# Altium footprint library 贴片电感.PcbLib: 92 footprints (part 4 of 6)
Each footprint in its own frame and in the unit in brackets; x right, y up, seen from the top. Pads: shape width x height; smd on the part's side, far side on the other; paste and mask are expansions set on the pad; w line width, h text height; cw(c..) or ccw(c..) is an arc to the next point about the centre after c.
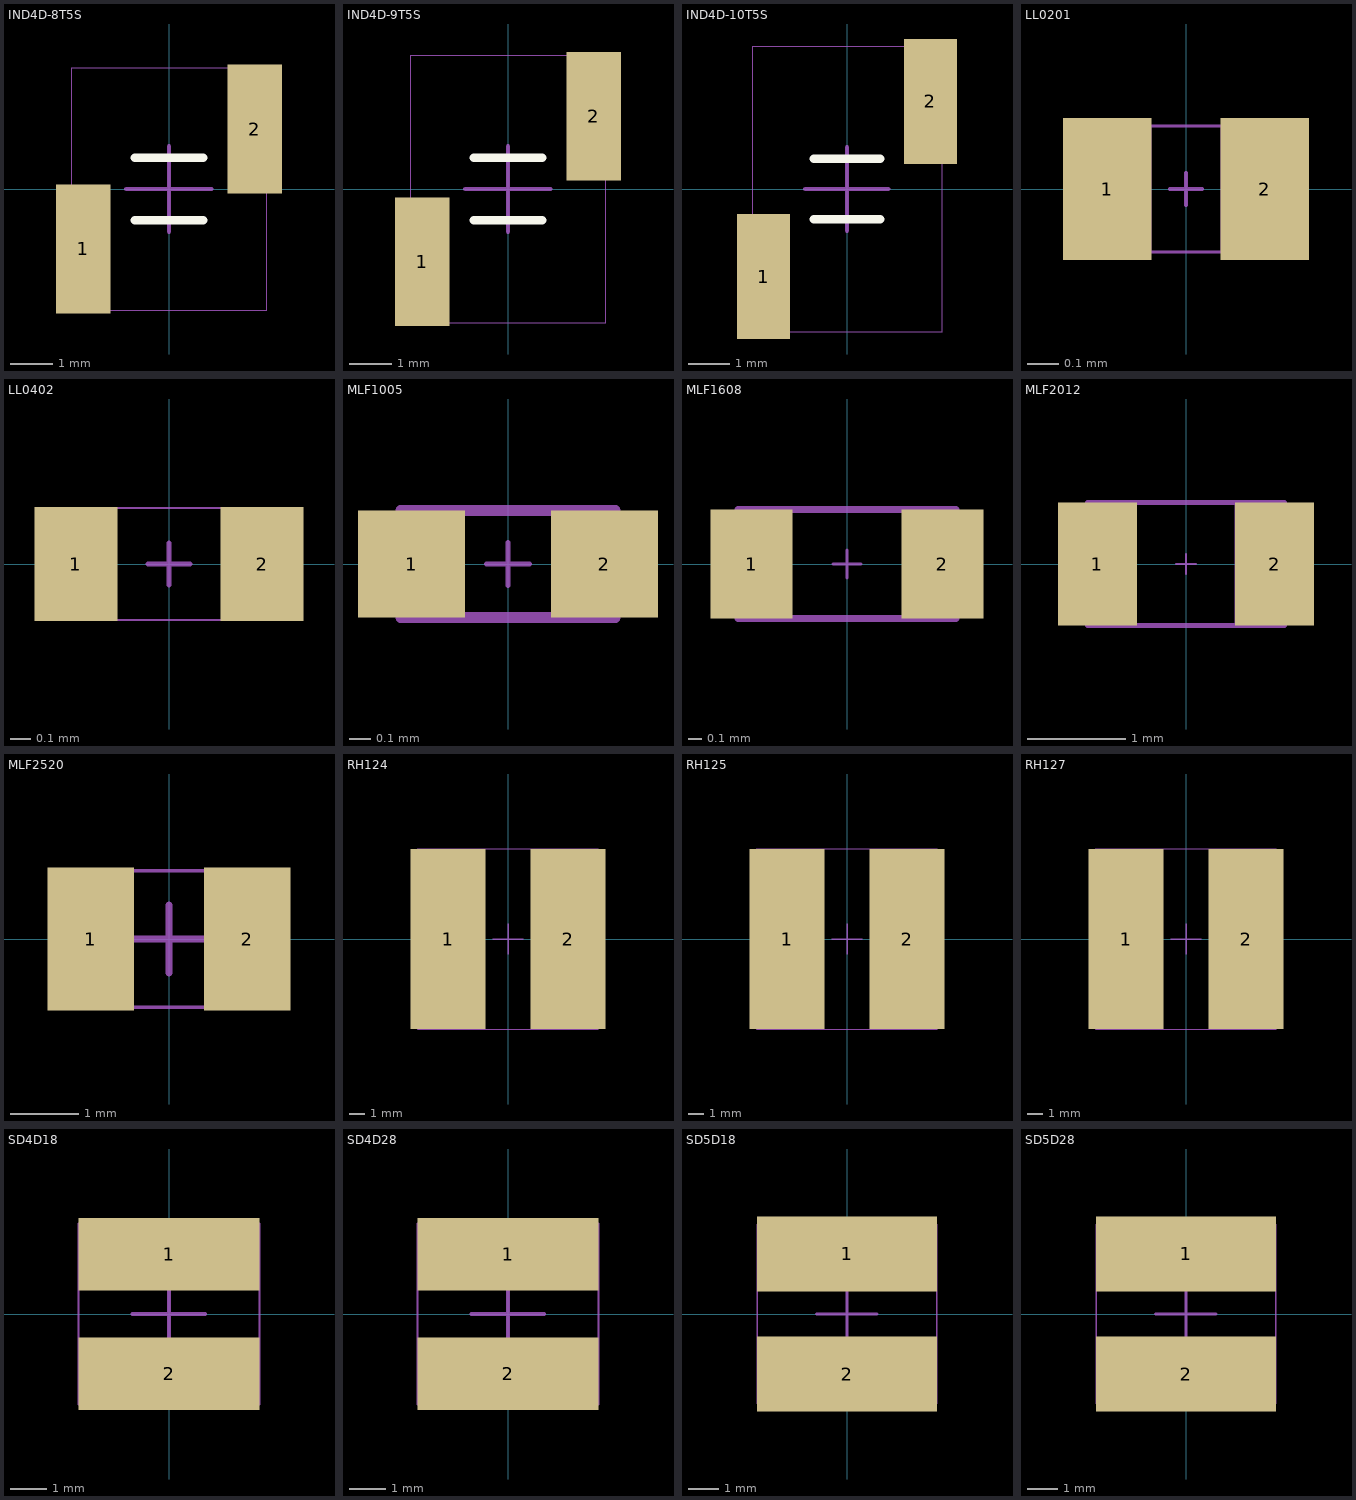
[diagram p3: the footprints below, top view; thin cyan lines are the x and y axes]

## IND4D-8T5S [mm] "贴片空芯线圈"
height 5.2
pads (2):
  rect 1.27x3 smd: 1(-2,-1.4) 2(2,1.4)
Top Overlay:
  lines w0.2: -0.8,-0.725 0.8,-0.725 ; -0.8,0.725 0.8,0.725
Mechanical 13:
  lines w0.01: -2.264,-2.825 2.286,-2.825 2.286,2.825 -2.264,2.825 -2.264,-2.825
Mechanical 15:
  lines w0.1: -1,0 0.991,0 ; 0,-1 0,1
3D body: height 5.43, standoff -0.01, extent -2.264,-2.825 2.286,2.825

## IND4D-9T5S [mm] "贴片空芯线圈"
height 5.2
pads (2):
  rect 1.27x3 smd: 1(-2,-1.7) 2(2,1.7)
Top Overlay:
  lines w0.2: -0.8,-0.725 0.8,-0.725 ; -0.8,0.725 0.8,0.725
Mechanical 13:
  lines w0.01: -2.264,-3.125 2.286,-3.125 2.286,3.125 -2.264,3.125 -2.264,-3.125
Mechanical 15:
  lines w0.1: -1,0 0.991,0 ; 0,-1 0,1
3D body: height 5.43, standoff 0, extent -2.264,-3.125 2.286,3.125

## IND4D-10T5S [mm] "贴片空芯线圈"
height 5.2
pads (2):
  rect 1.27x3 smd: 1(-2,-2.1) 2(2,2.1)
Top Overlay:
  lines w0.2: -0.8,-0.725 0.8,-0.725 ; -0.8,0.725 0.8,0.725
Mechanical 13:
  lines w0.01: -2.264,-3.425 2.286,-3.425 2.286,3.425 -2.264,3.425 -2.264,-3.425
Mechanical 15:
  lines w0.1: -1,0 0.991,0 ; 0,-1 0,1
3D body: height 5.43, standoff 0, extent -2.264,-3.425 2.286,3.425

## LL0201 [mm] "muRata线绕贴片电感"
height 0.229
pads (2):
  rect 0.28x0.45 smd: 1(-0.25,0) 2(0.25,0)
Mechanical 13:
  lines w0.01: -0.265,-0.2 -0.265,0.2 0.265,0.2 0.265,-0.2 -0.265,-0.2
Mechanical 15:
  lines w0.01: -0.115,-0.2 -0.115,0.2 ; 0.115,-0.2 0.115,0.2 ; -0.265,-0.2 0.265,-0.2 0.265,0.2 -0.265,0.2 -0.265,-0.2
  lines w0.012: -0.051,0 0,0 ; 0,-0.051 0,0 ; 0,0.051 0,0 ; 0.051,0 0,0
3D body: height 0.4, standoff 0, extent -0.266,-0.2 0.265,0.201

## LL0402 [mm] "muRata线绕贴片电感"
height 0.55
pads (2):
  rect 0.4x0.55 smd: 1(-0.45,0) 2(0.45,0)
Mechanical 13:
  lines w0.01: -0.5,-0.27 -0.5,0.27 0.5,0.27 0.5,-0.27 -0.5,-0.27
Mechanical 15:
  lines w0.025: -0.1,0 0.1,0 ; 0,-0.1 0,0.1
3D body: height 0.54, standoff 0, extent -0.5,-0.27 0.5,0.27

## MLF1005 [mm] "0402 普通贴片电感"
height 0.5
pads (2):
  rect 0.5x0.5 smd: 1(-0.45,0) 2(0.45,0)
Mechanical 13:
  lines w0.05: -0.5,-0.25 0.5,-0.25 0.5,0.25 -0.5,0.25 -0.5,-0.25
Mechanical 15:
  lines w0.01: -0.4,-0.25 -0.4,0.25 ; 0.4,-0.25 0.4,0.25 ; -0.5,-0.25 -0.5,0.25 0.5,0.25 0.5,-0.25 -0.5,-0.25
  lines w0.025: -0.1,0 0.1,0 ; 0,-0.1 0,0.1
3D body: height 0.5, standoff 0, extent -0.5,-0.25 0.5,0.25

## MLF1608 [mm] "贴片磁珠"
height 0.8
pads (2):
  rect 0.6x0.8 smd: 1(-0.7,0) 2(0.7,0)
Mechanical 13:
  lines w0.05: -0.8,-0.4 -0.8,0.4 0.8,0.4 0.8,-0.4 -0.8,-0.4
Mechanical 15:
  lines w0.01: -0.5,-0.4 -0.5,0.4 ; 0.5,-0.4 0.5,0.4 ; -0.8,-0.4 -0.8,0.4 0.8,0.4 0.8,-0.4 -0.8,-0.4
  lines w0.025: -0.1,0 0.1,0 ; 0,-0.1 0,0.1
3D body: height 0.8, standoff 0, extent -0.8,-0.4 0.8,0.4

## MLF2012 [mm] "0805 普通贴片电感"
height 1.25
pads (2):
  rect 0.8x1.25 smd: 1(-0.9,0) 2(0.9,0)
Mechanical 13:
  lines w0.05: -1,-0.625 1,-0.625 1,0.625 -1,0.625 -1,-0.625
Mechanical 15:
  lines w0.01: -0.5,-0.625 -0.5,0.625 ; 0.5,-0.625 0.5,0.625 ; -1,-0.625 1,-0.625 1,0.625 -1,0.625 -1,-0.625
  lines w0.025: -0.1,0 0.1,0 ; 0,-0.1 0,0.1
3D body: height 0.87, standoff 0.02, extent -1,-0.625 1,0.625

## MLF2520 [mm] "SF40MHz   2520[1008]贴片电感 贴片磁珠"
height 0.9
pads (2):
  rect 1.27x2.1 smd: 1(-1.15,0) 2(1.15,0)
Mechanical 13:
  lines w0.05: -1.25,-1 -1.25,1 1.25,1 1.25,-1 -1.25,-1
Mechanical 15:
  lines w0.1: -0.5,0 0.5,0 ; 0,-0.5 0,0.5
3D body: height 0.9, standoff 0, extent -1.25,-1 1.25,1

## RH124 [mm] "贴片蔽磁电感"
height 4.5
pads (2):
  rect 5x12 smd: 1(-4,0) 2(4,0)
Mechanical 13:
  lines w0.05: -6,-6 6,-6 6,6 -6,6 -6,-6
Mechanical 15:
  lines w0.1: -1.016,0 1,0 ; 0,-1 0,1
3D body: height -0.5, standoff -5, extent -6,-6 6,6

## RH125 [mm] "贴片蔽磁电感"
height 6
pads (2):
  rect 5x12 smd: 1(-4,0) 2(4,0)
Mechanical 13:
  lines w0.05: -6,-6 6,-6 6,6 -6,6 -6,-6
Mechanical 15:
  lines w0.1: -1.016,0 1,0 ; 0,-1 0,1
3D body: height -0.5, standoff -6.5, extent -6,-6 6,6

## RH127 [mm] "贴片蔽磁电感"
height 8
pads (2):
  rect 5x12 smd: 1(-4,0) 2(4,0)
Mechanical 13:
  lines w0.05: -6,-6 -6,6 6,6 6,-6 -6,-6
Mechanical 15:
  lines w0.1: -1.016,0 1,0 ; 0,-1 0,1
3D body: height 8.01, standoff 0, extent -6,-6 6,6

## SD4D18 [mm] "贴片蔽磁电感"
height 2
pads (2):
  rect 5x2 smd: 1(0,1.65) 2(0,-1.65)
Mechanical 13:
  lines w0.05: -2.5,-2.5 2.5,-2.5 2.5,2.5 -2.5,2.5 -2.5,-2.5
Mechanical 15:
  lines w0.1: -1.016,0 1,0 ; 0,-1 0,1
3D body: height 2, standoff 0, extent -2.5,-2.5 2.5,2.5

## SD4D28 [mm] "贴片蔽磁电感"
height 3
pads (2):
  rect 5x2 smd: 1(0,1.65) 2(0,-1.65)
Mechanical 13:
  lines w0.05: -2.5,-2.5 -2.5,2.5 2.5,2.5 2.5,-2.5 -2.5,-2.5
Mechanical 15:
  lines w0.1: -1.016,0 1,0 ; 0,-1 0,1
3D body: height 3, standoff 0, extent -2.5,-2.5 2.5,2.5

## SD5D18 [mm] "贴片蔽磁电感"
height 2
pads (2):
  rect 6x2.5 smd: 1(0,2) 2(0,-2)
Mechanical 13:
  lines w0.05: -3,-3 -3,3 3,3 3,-3 -3,-3
Mechanical 15:
  lines w0.1: -1.016,0 1,0 ; 0,-1 0,1
3D body: height 2, standoff 0, extent -3,-3 3,3

## SD5D28 [mm] "贴片蔽磁电感"
height 3
pads (2):
  rect 6x2.5 smd: 1(0,2) 2(0,-2)
Mechanical 13:
  lines w0.05: -3,-3 3,-3 3,3 -3,3 -3,-3
Mechanical 15:
  lines w0.1: -1.016,0 1,0 ; 0,-1 0,1
3D body: height 3, standoff 0, extent -3,-3 3,3